# Altium footprint library Intelliclone.PcbLib: 372 footprints (part 17 of 24)
Each footprint in its own frame and in the unit in brackets; x right, y up, seen from the top. Pads: shape width x height; smd on the part's side, far side on the other; paste and mask are expansions set on the pad; w line width, h text height; cw(c..) or ccw(c..) is an arc to the next point about the centre after c.
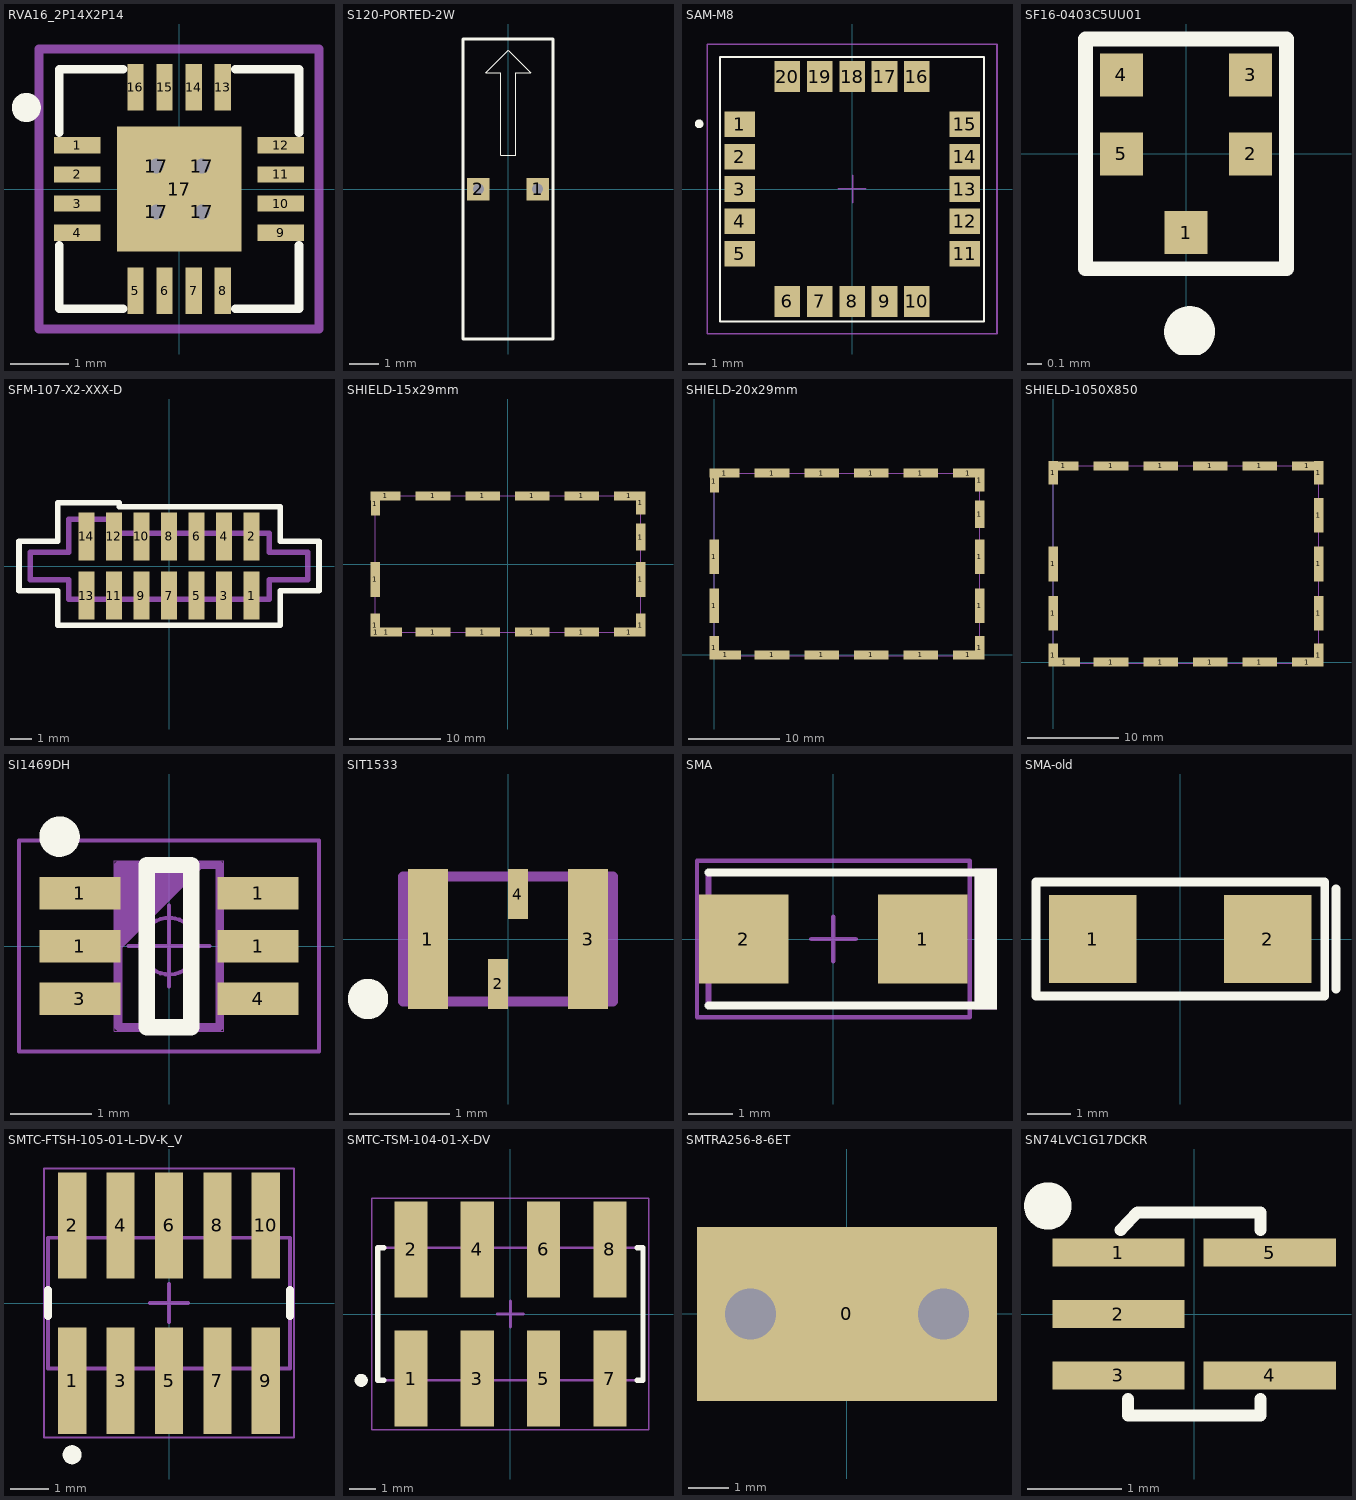
[diagram p16: the footprints below, top view; thin cyan lines are the x and y axes]

## RVA16_2P14X2P14 [mm]
pads (21):
  rect 0.8x0.28 smd paste-0.14: 1(-1.75,0.75) 2(-1.75,0.25) 3(-1.75,-0.25) 4(-1.75,-0.75) 9(1.75,-0.75) 10(1.75,-0.25) 11(1.75,0.25) 12(1.75,0.75)
  rect 0.28x0.8 smd paste-0.14: 5(-0.75,-1.75) 6(-0.25,-1.75) 7(0.25,-1.75) 8(0.75,-1.75) 13(0.75,1.75) 14(0.25,1.75) 15(-0.25,1.75) 16(-0.75,1.75)
  round 0.508 hole 0.254: 17(-0.394,-0.394) 17(-0.394,0.394) 17(0.394,-0.394) 17(0.394,0.394)
  rect 2.14x2.14 smd paste-1.057 mask-1.054: 17(0,0)
Top Overlay:
  circle w0.25: c-2.625,1.4 r0.125
  lines w0.152: -2.057,-0.966 -2.057,-2.057 -0.966,-2.057 ; -2.057,0.966 -2.057,2.057 -0.966,2.057 ; 0.966,-2.057 2.057,-2.057 2.057,-0.966 ; 0.966,2.057 2.057,2.057 2.057,0.966
Top Paste:
  region: -1.375,0.865 -2.125,0.865 -2.125,0.635 -1.375,0.635
  region: -1.375,0.365 -2.125,0.365 -2.125,0.135 -1.375,0.135
  region: -1.375,-0.135 -2.125,-0.135 -2.125,-0.365 -1.375,-0.365
  region: -1.375,-0.635 -2.125,-0.635 -2.125,-0.865 -1.375,-0.865
  region: -0.635,-1.375 -0.865,-1.375 -0.865,-2.125 -0.635,-2.125
  region: -0.135,-1.375 -0.365,-1.375 -0.365,-2.125 -0.135,-2.125
  region: 0.365,-1.375 0.135,-1.375 0.135,-2.125 0.365,-2.125
  region: 0.865,-1.375 0.635,-1.375 0.635,-2.125 0.865,-2.125
  region: 2.125,-0.635 1.375,-0.635 1.375,-0.865 2.125,-0.865
  region: 2.125,-0.135 1.375,-0.135 1.375,-0.365 2.125,-0.365
  region: 2.125,0.365 1.375,0.365 1.375,0.135 2.125,0.135
  region: 2.125,0.865 1.375,0.865 1.375,0.635 2.125,0.635
  region: 0.865,2.125 0.635,2.125 0.635,1.375 0.865,1.375
  region: 0.365,2.125 0.135,2.125 0.135,1.375 0.365,1.375
  region: -0.135,2.125 -0.365,2.125 -0.365,1.375 -0.135,1.375
  region: -0.635,2.125 -0.865,2.125 -0.865,1.375 -0.635,1.375
  region: -0.494,0.995 -0.995,0.995 -0.995,0.494 -0.635,0.494 -0.494,0.635
  region: -0.635,0.294 -0.995,0.294 -0.995,-0.294 -0.635,-0.294 -0.494,-0.152 -0.494,0.152
  region: -0.635,-0.494 -0.995,-0.494 -0.995,-0.995 -0.494,-0.995 -0.494,-0.635
  region: 0.294,0.995 -0.294,0.995 -0.294,0.635 -0.152,0.494 0.152,0.494 0.294,0.635
  region: 0.152,0.294 -0.152,0.294 -0.294,0.152 -0.294,-0.152 -0.152,-0.294 0.152,-0.294 0.294,-0.152 0.294,0.152
  region: 0.152,-0.494 -0.152,-0.494 -0.294,-0.635 -0.294,-0.995 0.294,-0.995 0.294,-0.635
  region: 0.995,0.995 0.494,0.995 0.494,0.635 0.635,0.494 0.995,0.494
  region: 0.995,0.294 0.635,0.294 0.494,0.152 0.494,-0.152 0.635,-0.294 0.995,-0.294
  region: 0.995,-0.494 0.635,-0.494 0.494,-0.635 0.494,-0.995 0.995,-0.995
Top Solder:
  region: -1.28,0.96 -2.22,0.96 -2.22,0.54 -1.28,0.54
  region: -1.28,0.46 -2.22,0.46 -2.22,0.04 -1.28,0.04
  region: -1.28,-0.04 -2.22,-0.04 -2.22,-0.46 -1.28,-0.46
  region: -1.28,-0.54 -2.22,-0.54 -2.22,-0.96 -1.28,-0.96
  region: -0.54,-1.28 -0.96,-1.28 -0.96,-2.22 -0.54,-2.22
  region: -0.04,-1.28 -0.46,-1.28 -0.46,-2.22 -0.04,-2.22
  region: 0.46,-1.28 0.04,-1.28 0.04,-2.22 0.46,-2.22
  region: 0.96,-1.28 0.54,-1.28 0.54,-2.22 0.96,-2.22
  region: 2.22,-0.54 1.28,-0.54 1.28,-0.96 2.22,-0.96
  region: 2.22,-0.04 1.28,-0.04 1.28,-0.46 2.22,-0.46
  region: 2.22,0.46 1.28,0.46 1.28,0.04 2.22,0.04
  region: 2.22,0.96 1.28,0.96 1.28,0.54 2.22,0.54
  region: 0.96,2.22 0.54,2.22 0.54,1.28 0.96,1.28
  region: 0.46,2.22 0.04,2.22 0.04,1.28 0.46,1.28
  region: -0.04,2.22 -0.46,2.22 -0.46,1.28 -0.04,1.28
  region: -0.54,2.22 -0.96,2.22 -0.96,1.28 -0.54,1.28
  region: -1.134,0.594 -1.134,1.134 1.134,1.134 1.134,0.594
  region: -1.134,-0.194 -1.134,0.194 1.134,0.194 1.134,-0.194
  region: -1.134,-1.134 -1.134,-0.594 1.134,-0.594 1.134,-1.134
  region: -1.134,-1.134 -1.134,1.134 -0.594,1.134 -0.594,-1.134
  region: 0.194,-1.134 0.194,1.134 -0.194,1.134 -0.194,-1.134
  region: 0.594,-1.134 0.594,1.134 1.134,1.134 1.134,-1.134
Mechanical 15:
  lines w0.152: -2.404,-2.404 -2.404,2.404 2.404,2.404 2.404,-2.404 -2.404,-2.404
3D body "RVA0016A.stp": height 1, standoff 0, extent -1.75,-1.75 1.75,1.75

## S120-PORTED-2W [mil] "Valve, S120"
pads (2):
  rect 30x30 hole 15 square: 1(39.37,0) 2(-39.37,0)
Top Overlay:
  lines w1: -30,155 -10,155 -10,45 10,45 10,155 30,155 0,185 -30,155
  lines w4.02: -60,-200 60,-200 60,200 -60,200 -60,-200
3D body: height 84.8, standoff 35, extent -24.95,200 24.95,290
3D body: height 84.8, standoff 35, extent -25,-300 24.9,-200
3D body: height 119.53, standoff 0, extent -60,-200 59.76,200
3D body: height 130, standoff 120, extent -30,45 30,185

## SAM-M8 [mm] "ublox SAM antenna module"
pads (20):
  rect 1.8x1.5 smd paste-1.8: 1(-6.6,3.8) 2(-6.6,1.9) 3(-6.6,0) 4(-6.6,-1.9) 5(-6.6,-3.8) 11(6.6,-3.8) 12(6.6,-1.9) 13(6.6,0) 14(6.6,1.9) 15(6.6,3.8)
  rect 1.5x1.8 smd paste-1.8: 6(-3.8,-6.6) 7(-1.9,-6.6) 8(0,-6.6) 9(1.9,-6.6) 10(3.8,-6.6) 16(3.8,6.6) 17(1.9,6.6) 18(0,6.6) 19(-1.9,6.6) 20(-3.8,6.6)
Top Overlay:
  circle w0.254: c-8.975,3.825 r0.127
  lines w0.1: -7.751,-7.775 -7.751,-0.024 -7.751,7.741 7.741,7.741 7.741,-0.009 7.741,-7.774 -0.001,-7.774 -7.75,-7.774
Top Paste:
  region: 7.471,3.665 6.752,3.665 6.752,3.085 7.471,3.085
  region: 7.467,4.502 6.748,4.502 6.748,3.922 7.467,3.922
  region: 6.453,3.669 5.734,3.669 5.734,3.089 6.453,3.089
  region: 6.453,4.499 5.734,4.499 5.734,3.919 6.453,3.919
  region: 7.467,1.769 6.748,1.769 6.748,1.189 7.467,1.189
  region: 7.463,2.606 6.744,2.606 6.744,2.026 7.463,2.026
  region: 6.449,1.773 5.73,1.773 5.73,1.193 6.449,1.193
  region: 6.449,2.603 5.73,2.603 5.73,2.023 6.449,2.023
  region: 7.467,-2.037 6.748,-2.037 6.748,-2.617 7.467,-2.617
  region: 7.463,-1.2 6.744,-1.2 6.744,-1.78 7.463,-1.78
  region: 6.449,-2.033 5.73,-2.033 5.73,-2.613 6.449,-2.613
  region: 6.449,-1.203 5.73,-1.203 5.73,-1.783 6.449,-1.783
  region: -5.731,-3.933 -6.45,-3.933 -6.45,-4.513 -5.731,-4.513
  region: -5.735,-3.096 -6.454,-3.096 -6.454,-3.676 -5.735,-3.676
  region: -6.749,-3.929 -7.468,-3.929 -7.468,-4.509 -6.749,-4.509
  region: -6.749,-3.099 -7.468,-3.099 -7.468,-3.679 -6.749,-3.679
  region: -5.731,-2.037 -6.45,-2.037 -6.45,-2.617 -5.731,-2.617
  region: -5.735,-1.2 -6.454,-1.2 -6.454,-1.78 -5.735,-1.78
  region: -6.749,-2.033 -7.468,-2.033 -7.468,-2.613 -6.749,-2.613
  region: -6.749,-1.203 -7.468,-1.203 -7.468,-1.783 -6.749,-1.783
  region: -5.731,1.769 -6.45,1.769 -6.45,1.189 -5.731,1.189
  region: -5.735,2.606 -6.454,2.606 -6.454,2.026 -5.735,2.026
  region: -6.749,1.773 -7.468,1.773 -7.468,1.193 -6.749,1.193
  region: -6.749,2.603 -7.468,2.603 -7.468,2.023 -6.749,2.023
  region: -6.749,4.508 -7.468,4.508 -7.468,3.928 -6.749,3.928
  region: -6.749,3.678 -7.468,3.678 -7.468,3.098 -6.749,3.098
  region: -5.735,4.511 -6.454,4.511 -6.454,3.931 -5.735,3.931
  region: -5.731,3.674 -6.45,3.674 -6.45,3.094 -5.731,3.094
  region: 2.594,6.746 2.594,7.465 2.014,7.465 2.014,6.746
  region: 1.764,6.746 1.764,7.465 1.184,7.465 1.184,6.746
  region: 2.597,5.732 2.597,6.451 2.017,6.451 2.017,5.732
  region: 1.76,5.728 1.76,6.447 1.18,6.447 1.18,5.728
  region: -1.193,6.741 -1.193,7.46 -1.773,7.46 -1.773,6.741
  region: -2.023,6.741 -2.023,7.46 -2.603,7.46 -2.603,6.741
  region: -1.19,5.727 -1.19,6.446 -1.77,6.446 -1.77,5.727
  region: -2.027,5.723 -2.027,6.442 -2.607,6.442 -2.607,5.723
  region: -0.126,-7.473 -0.126,-6.754 -0.706,-6.754 -0.706,-7.473
  region: 0.711,-7.469 0.711,-6.75 0.131,-6.75 0.131,-7.469
  region: -0.122,-6.455 -0.122,-5.736 -0.702,-5.736 -0.702,-6.455
  region: 0.708,-6.455 0.708,-5.736 0.128,-5.736 0.128,-6.455
  region: -2.032,-7.466 -2.032,-6.747 -2.612,-6.747 -2.612,-7.466
  region: -1.195,-7.462 -1.195,-6.743 -1.775,-6.743 -1.775,-7.462
  region: -2.028,-6.448 -2.028,-5.729 -2.608,-5.729 -2.608,-6.448
  region: -1.198,-6.448 -1.198,-5.729 -1.778,-5.729 -1.778,-6.448
  region: -3.098,-6.455 -3.098,-5.736 -3.678,-5.736 -3.678,-6.455
  region: -3.928,-6.455 -3.928,-5.736 -4.508,-5.736 -4.508,-6.455
  region: -3.095,-7.469 -3.095,-6.75 -3.675,-6.75 -3.675,-7.469
  region: -3.932,-7.473 -3.932,-6.754 -4.512,-6.754 -4.512,-7.473
  region: 2.604,-6.446 2.604,-5.727 2.024,-5.727 2.024,-6.446
  region: 1.774,-6.446 1.774,-5.727 1.194,-5.727 1.194,-6.446
  region: 2.607,-7.46 2.607,-6.741 2.027,-6.741 2.027,-7.46
  region: 1.77,-7.464 1.77,-6.745 1.19,-6.745 1.19,-7.464
  region: 3.666,-7.473 3.666,-6.754 3.086,-6.754 3.086,-7.473
  region: 4.503,-7.469 4.503,-6.75 3.923,-6.75 3.923,-7.469
  region: 3.67,-6.455 3.67,-5.736 3.09,-5.736 3.09,-6.455
  region: 4.5,-6.455 4.5,-5.736 3.92,-5.736 3.92,-6.455
  region: -3.937,5.732 -3.937,6.451 -4.517,6.451 -4.517,5.732
  region: -3.1,5.736 -3.1,6.455 -3.68,6.455 -3.68,5.736
  region: -3.933,6.75 -3.933,7.469 -4.513,7.469 -4.513,6.75
  region: -3.103,6.75 -3.103,7.469 -3.683,7.469 -3.683,6.75
  region: -0.131,5.732 -0.131,6.451 -0.711,6.451 -0.711,5.732
  region: 0.706,5.736 0.706,6.455 0.126,6.455 0.126,5.736
  region: -0.127,6.75 -0.127,7.469 -0.707,7.469 -0.707,6.75
  region: 0.703,6.75 0.703,7.469 0.123,7.469 0.123,6.75
  region: 3.665,5.732 3.665,6.451 3.085,6.451 3.085,5.732
  region: 4.502,5.736 4.502,6.455 3.922,6.455 3.922,5.736
  region: 3.669,6.75 3.669,7.469 3.089,7.469 3.089,6.75
  region: 4.499,6.75 4.499,7.469 3.919,7.469 3.919,6.75
  region: -6.749,0.698 -7.468,0.698 -7.468,0.118 -6.749,0.118
  region: -6.749,-0.132 -7.468,-0.132 -7.468,-0.712 -6.749,-0.712
  region: -5.735,0.701 -6.454,0.701 -6.454,0.121 -5.735,0.121
  region: -5.731,-0.136 -6.45,-0.136 -6.45,-0.716 -5.731,-0.716
  region: 6.449,-3.099 5.73,-3.099 5.73,-3.679 6.449,-3.679
  region: 6.449,-3.929 5.73,-3.929 5.73,-4.509 6.449,-4.509
  region: 7.463,-3.096 6.744,-3.096 6.744,-3.676 7.463,-3.676
  region: 7.467,-3.933 6.748,-3.933 6.748,-4.513 7.467,-4.513
  region: 6.449,0.698 5.73,0.698 5.73,0.118 6.449,0.118
  region: 6.449,-0.132 5.73,-0.132 5.73,-0.712 6.449,-0.712
  region: 7.463,0.701 6.744,0.701 6.744,0.121 7.463,0.121
  region: 7.467,-0.136 6.748,-0.136 6.748,-0.716 7.467,-0.716
Mechanical 15:
  lines w0.1: -0.8,0.017 0.028,0.017 ; 0.028,-0.8 0.028,0.017 ; 0.028,0.8 0.028,0.017 ; 0.8,0.017 0.028,0.017 ; -8.5,-8.5 8.5,-8.5 8.5,8.5 -8.5,8.5 -8.5,-8.5
3D body "SAM_AP214.STEP": height 6.41, standoff 0.03, extent -7.735,-7.744 7.765,7.756

## SF16-0403C5UU01 [mm]
pads (5):
  rect 0.3x0.3 smd: 1(0,-0.55) 2(0.45,0) 3(0.45,0.55) 4(-0.45,0.55) 5(-0.45,0)
Top Overlay:
  circle w0.254: c0.025,-1.24 r0.051
  lines w0.102: -0.7,-0.8 -0.7,0.8 0.7,0.8 0.7,-0.8 -0.7,-0.8
3D body: height 0.6, standoff 0.1, extent -0.689,-0.8 0.711,0.8

## SFM-107-X2-XXX-D [mil]
pads (14):
  rect 29x87.5 smd mask+2: 1(150,-53.75) 2(150,53.75) 3(100,-53.75) 4(100,53.75) 5(50,-53.75) 6(50,53.75) 7(0,-53.75) 8(0,53.75) 9(-50,-53.75) 10(-50,53.75) 11(-100,-53.75) 12(-100,53.75) 13(-150,-53.75) 14(-150,53.75)
Top Overlay:
  lines w10: -272.5,-45 -202.5,-45 -202.5,-107.5 202.5,-107.5 202.5,-45 272.5,-45 272.5,45 202.5,45 202.5,107.5 -90,107.5 -90,115 -202.5,115 -202.5,45 -272.5,45 -272.5,-45
Mechanical 1:
  lines w10: -252.5,-25 -182.5,-25 -182.5,-60 182.5,-60 182.5,-25 252.5,-25 252.5,25 182.5,25 182.5,60 -102.5,60 -102.5,85 -182.5,85 -182.5,25 -252.5,25 -252.5,-25
  text "J1" at -17.57,-18 h30
3D body "SFM-107-02-S-D.stp": height 183.94, standoff -1.06, extent -252.5,-82.68 252.5,84.82

## SHIELD-15x29mm [mm] "29mm\" x 15mm shield"
height 3
pads (20):
  rect 1x2.55 smd: 1(-14.607,-6.725) 1(-14.602,6.626) 1(14.608,-6.725) 1(14.608,6.728)
  rect 1x3.8 smd: 1(-14.607,-1.705) 1(14.608,-1.705)
  rect 1x1 smd: 1(-14.5,-7.5)
  rect 3.3x1 smd: 1(-13.457,7.5) 1(-13.332,-7.5) 1(13.338,-7.5) 1(13.338,7.5)
  rect 3.8x1 smd: 1(-8.252,-7.5) 1(-8.252,7.5) 1(-2.791,-7.5) 1(-2.791,7.5) 1(2.67,-7.5) 1(2.67,7.5) 1(8.131,-7.5) 1(8.131,7.5)
  rect 1x3 smd: 1(14.608,2.969)
Mechanical 13:
  lines w0.127: -14.608,-7.51 -14.608,7.49 14.608,7.49 14.608,-7.51 -14.608,-7.51
3D body: height 3, standoff 0, extent -14.617,-7.496 14.608,7.49

## SHIELD-20x29mm [mm] "29mm\" x 20mm shield"
height 3
pads (21):
  rect 1x2.55 smd: 1(-0.005,0.775) 1(0,19.126) 1(29.21,0.775) 1(29.21,19.228)
  rect 1x3.8 smd: 1(-0.005,5.385) 1(-0.005,10.795) 1(29.21,5.385) 1(29.21,10.795)
  rect 3.3x1 smd: 1(1.145,20) 1(1.27,0) 1(27.94,0) 1(27.94,20)
  rect 3.8x1 smd: 1(6.35,0) 1(6.35,20) 1(11.811,0) 1(11.811,20) 1(17.272,0) 1(17.272,20) 1(22.733,0) 1(22.733,20)
  rect 1x3 smd: 1(29.21,15.469)
Mechanical 13:
  lines w0.127: -0.015,-0.1 29.21,-0.1 29.21,19.99 -0.005,19.99 -0.005,-0.1
3D body: height 3, standoff 0, extent -0.015,-0.1 29.21,19.99

## SHIELD-1050X850 [mm] "1.050\" x .850\" shield"
height 3
pads (21):
  rect 1x2.55 smd: 1(-0.005,0.775) 1(-0.005,20.828) 1(29.21,0.775) 1(29.21,20.828)
  rect 1x3.8 smd: 1(-0.005,5.385) 1(-0.005,10.795) 1(29.21,5.385) 1(29.21,10.795) 1(29.21,16.18)
  rect 3.3x1 smd: 1(1.145,21.59) 1(1.27,0) 1(27.94,0) 1(27.94,21.59)
  rect 3.8x1 smd: 1(6.35,0) 1(6.35,21.59) 1(11.811,0) 1(11.811,21.59) 1(17.272,0) 1(17.272,21.59) 1(22.733,0) 1(22.733,21.59)
Mechanical 13:
  lines w0.127: -0.015,-0.1 29.21,-0.1 29.21,21.59 -0.015,21.59 ; -0.005,-0.1 -0.005,21.59
3D body: height 3, standoff 0, extent -0.015,-0.1 29.21,21.59

## SI1469DH [mm]
height 1
pads (6):
  rect 1x0.4 smd: 1(-1.1,0) 1(-1.1,0.65) 1(1.1,0) 1(1.1,0.65) 3(-1.1,-0.65) 4(1.1,-0.65)
Top Overlay:
  circle w0.25: c-1.35,1.35 r0.125
  lines w0.2: -0.275,-1 -0.275,1 0.275,1 0.275,-1 -0.275,-1
Mechanical 15:
  lines w0.1: -0.625,0 0.375,1 ; -0.625,0.1 0.275,1 ; -0.625,0.2 0.175,1 ; -0.625,0.3 0.075,1 ; -0.625,0.4 -0.025,1 ; -0.625,0.5 -0.125,1 ; -0.625,0.6 -0.225,1 ; -0.625,0.7 -0.325,1 ; -0.625,0.8 -0.425,1 ; -0.625,0.9 -0.525,1 ; -0.625,-1 -0.625,1 0.625,1 0.625,-1 -0.625,-1
Mechanical 20:
  circle w0.05: c0,0 r0.35
  lines w0.05: -0.5,0 0.5,0 ; 0,-0.5 0,0.5 ; -1.85,-1.3 -1.85,1.3 1.85,1.3 1.85,-1.3 -1.85,-1.3
Mechanical 21:
  lines w0.001: -0.675,-1.05 -0.675,1.05 0.675,1.05 0.675,-1.05 -0.675,-1.05

## SIT1533 [mm] "SiTime 2.0 x 1.2 XO Package"
height 0.6
pads (4):
  rect 0.4x1.4 smd: 1(-0.8,0) 3(0.8,0)
  rect 0.2x0.5 smd: 2(-0.1,-0.45) 4(0.1,0.45)
Top Overlay:
  circle w0.254: c-1.4,-0.6 r0.075
Mechanical 5:
  lines w0.1: -1.05,-0.625 1.05,-0.625 1.05,0.625 -1.05,0.625 -1.05,-0.625
3D body: height 0.6, standoff 0, extent -1,-0.6 1,0.6

## SMA [mm] "Molded Diode, 2-Leads, Body 4.3x2.6mm, IPC Medium Density, based on OnSemi component dimensions and land pattern"
height 2.27
pads (2):
  rect 2x2 smd: 1(2,0) 2(-2,0)
Top Overlay:
  region: 3.658,1.575 3.15,1.575 3.15,-1.575 3.658,-1.575
  lines w0.178: -2.794,-1.486 3.327,-1.486 ; -2.794,1.486 3.327,1.486
Mechanical 5:
  region: 3.658,1.575 3.15,1.575 3.15,-1.575 3.658,-1.575
  lines w0.127: 3.327,-1.486 -2.794,-1.486 -2.794,1.486 3.327,1.486
  text ".Designator" at 2.769,0.33 h1.02
Mechanical 15:
  lines w0.1: -0.5,0 0.5,0 ; 0,-0.5 0,0.5 ; -3.05,-1.75 3.05,-1.75 3.05,1.75 -3.05,1.75 -3.05,-1.75
3D body "SMA_nominal.stp": height 2.42, standoff 0.02, extent -2.6,-1.3 2.6,1.3

## SMA-old [mm]
pads (2):
  rect 2x2 smd: 1(-2,0) 2(2,0)
Top Overlay:
  lines w0.2: 3.556,-1.143 3.556,1.143 ; -3.3,-1.3 3.3,-1.3 3.3,1.3 -3.3,1.3 -3.3,0 -3.3,-1.3
3D body: height 2.16, standoff 0.1, extent -2.286,-1.3 2.286,1.3

## SMTC-FTSH-105-01-L-DV-K_V [mm] "CONN, 10-Leads, Body 6.35x3.43mm, Pitch 1.27mm"
height 6.25
pads (10):
  rect 0.74x2.79 smd: 1(-2.54,-2.035) 2(-2.54,2.035) 3(-1.27,-2.035) 4(-1.27,2.035) 5(0,-2.035) 6(0,2.035) 7(1.27,-2.035) 8(1.27,2.035) 9(2.54,-2.035) 10(2.54,2.035)
Top Overlay:
  circle w0.25: c-2.54,-3.98 r0.125
  lines w0.2: -3.175,-0.341 -3.175,0.341 ; 3.175,-0.341 3.175,0.341
Mechanical 13:
  lines w0.1: -3.175,-1.715 3.175,-1.715 3.175,1.715 -3.175,1.715 -3.175,-1.715
Mechanical 15:
  lines w0.05: -3.275,-3.53 -3.275,3.53 3.275,3.53 3.275,-3.53 -3.275,-3.53
  lines w0.1: -0.5,0 0.5,0 ; 0,-0.5 0,0.5
3D body "FTSH-105-01-L-DV-K.stp": height 6.12, standoff 0, extent -3.175,-2.921 3.175,2.921

## SMTC-TSM-104-01-X-DV [mm] "Double Row Gullwing ASM, 2x4 Pins, Vertical, 2.54mm Pitch, Male"
height 9.9
pads (8):
  rect 1.27x3.68 smd: 1(-3.81,-2.475) 2(-3.81,2.475) 3(-1.27,-2.475) 4(-1.27,2.475) 5(1.27,-2.475) 6(1.27,2.475) 7(3.81,-2.475) 8(3.81,2.475)
Top Overlay:
  circle w0.25: c-5.715,-2.54 r0.125
  lines w0.2: -4.845,-2.54 -5.08,-2.54 -5.08,2.54 -4.845,2.54 ; 4.845,-2.54 5.08,-2.54 5.08,2.54 4.845,2.54
Mechanical 13:
  lines w0.1: -5.08,-2.54 5.08,-2.54 5.08,2.54 -5.08,2.54 -5.08,-2.54
Mechanical 15:
  lines w0.05: -5.305,-4.44 -5.305,4.44 5.305,4.44 5.305,-4.44 -5.305,-4.44
  lines w0.1: -0.5,0 0.5,0 ; 0,-0.5 0,0.5
3D body "TSM-104-01-X-DV.step": height 9.65, standoff 0, extent -5.08,-3.683 5.08,3.683

## SMTRA256-8-6ET [mil]
pads (3):
  rect 294x171 smd: 0(0,0)
  rect 0x0 hole 50 unplated: 1(-94.5,0) 1(94.5,0)
3D body "20160829-163535-80707189.stp": height 390, standoff -40, extent -127.22,-93.5 123.28,94.5

## SN74LVC1G17DCKR [mil]
height 100
pads (5):
  rect 55.1x11.8 smd: 1(-31.5,25.6) 2(-31.5,0) 3(-31.5,-25.6) 4(31.5,-25.6) 5(31.5,25.6)
Top Overlay:
  circle w9.84: c-60.92,45 r4.92
  lines w5: -30.56,35.05 -23.56,42.32 27.56,42.32 27.56,35.05 ; -27.56,-35.37 -27.56,-42.32 27.56,-42.32 27.56,-35.37
3D body: height 43, standoff 4, extent -27,-41 28,42